# Altium footprint library PCBLIB.PcbLib: 557 footprints (part 11 of 36)
Each footprint in its own frame and in the unit in brackets; x right, y up, seen from the top. Pads: shape width x height; smd on the part's side, far side on the other; paste and mask are expansions set on the pad; w line width, h text height; cw(c..) or ccw(c..) is an arc to the next point about the centre after c.
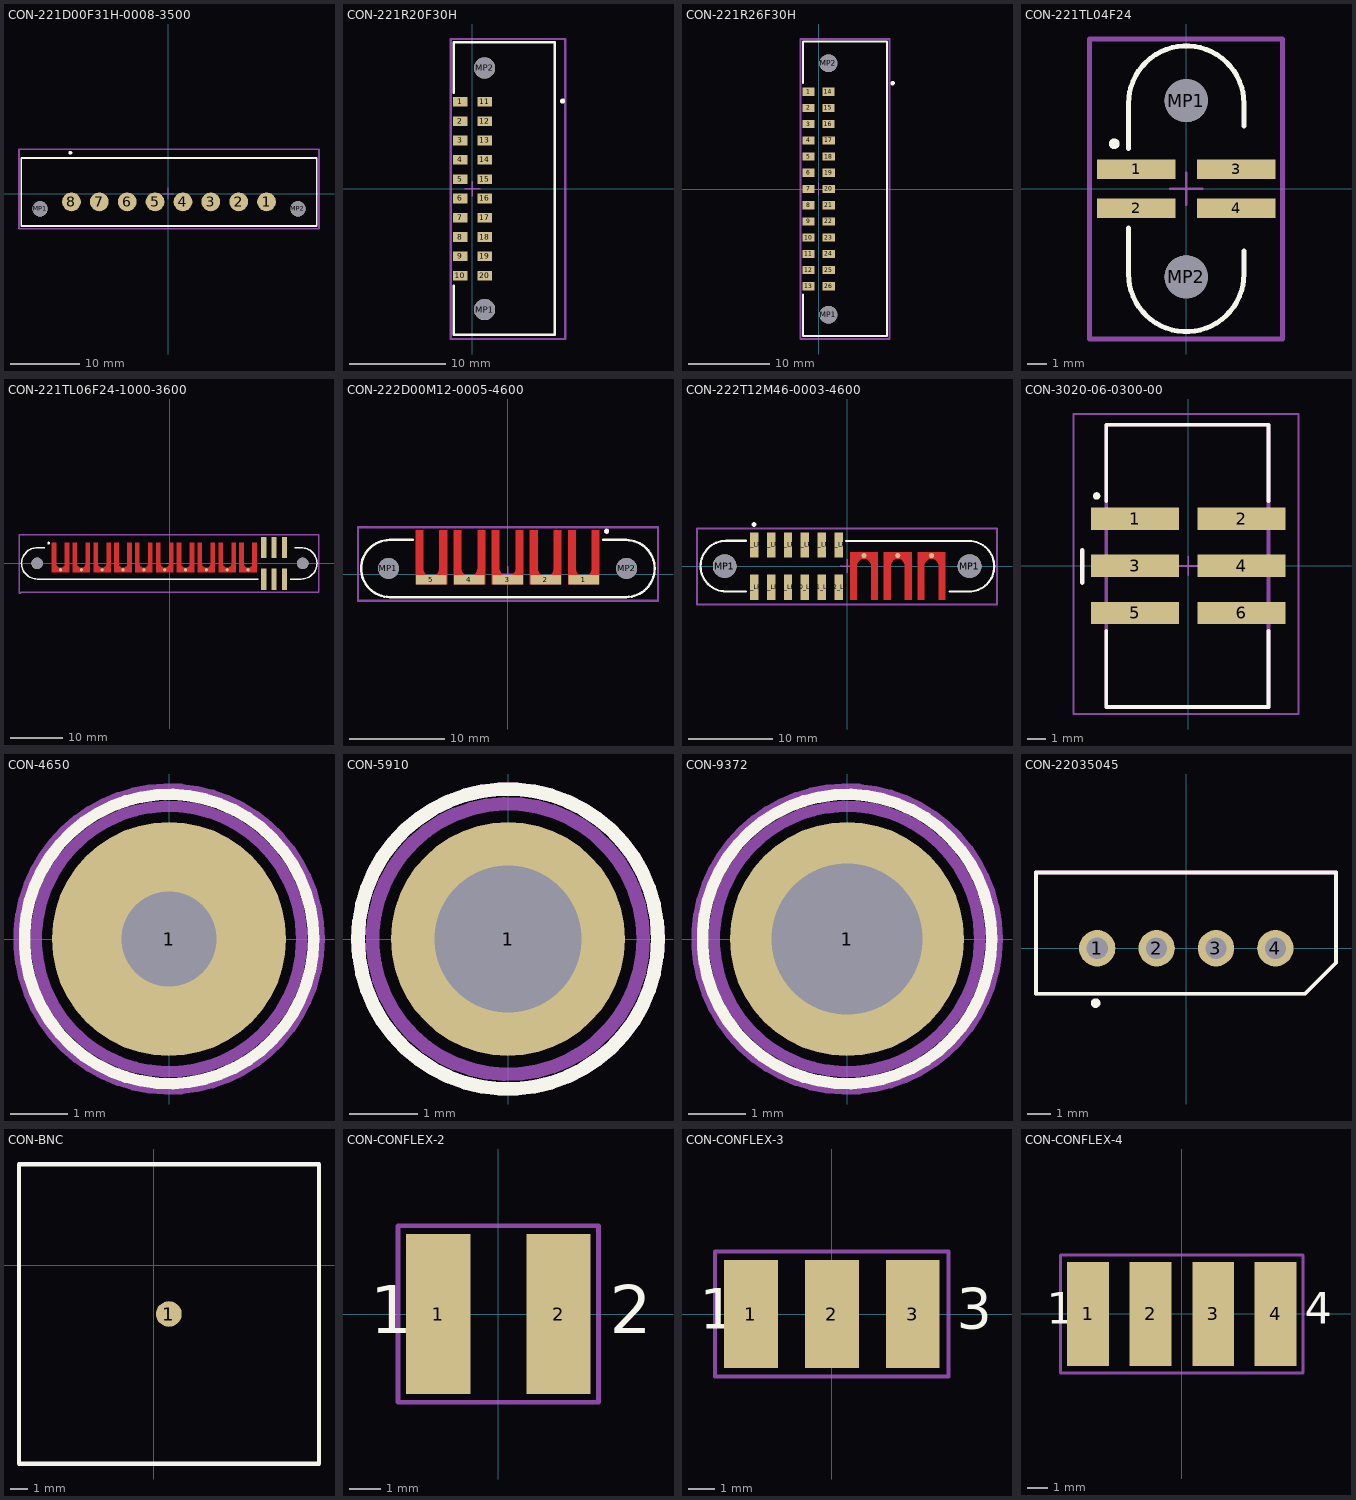
[diagram p10: the footprints below, top view; thin cyan lines are the x and y axes]

## CON-221D00F31H-0008-3500 [mm]
pads (10):
  round 2.7 smd: 1(14.1,-1.2) 2(10.1,-1.2) 3(6.1,-1.2) 4(2.1,-1.2) 5(-1.9,-1.2) 6(-5.9,-1.2) 7(-9.9,-1.2) 8(-13.9,-1.2)
  round 2.2 hole 2.2 unplated: MP1(-18.4,-2.2) MP2(18.6,-2.2)
Top Overlay:
  circle w0.3: c-14.05,5.85 r0.12
  lines w0.254: -21.1,-4.675 21.3,-4.675 21.3,5.1 -21.1,5.1 -21.1,-4.675
Mechanical 15:
  lines w0.15: -0.8,0 0,0 ; 0,-0.8 0,0 ; 0,0.8 0,0 ; 0.8,0 0,0
  lines w0.254: -21.425,-5.05 21.625,-5.05 21.625,6.35 -21.425,6.35 -21.425,-5.05
3D body "221D00F31H-0008-3500.STEP": height 5.33, standoff -7.5, extent -20.9,-4.5 21.1,4.85

## CON-221R20F30H [mm]
pads (22):
  rect 1.5x1 smd mask+0.05: 1(-1.25,9) 2(-1.25,7) 3(-1.25,5) 4(-1.25,3) 5(-1.25,1) 6(-1.25,-1) 7(-1.25,-3) 8(-1.25,-5) 9(-1.25,-7) 10(-1.25,-9) 11(1.25,9) 12(1.25,7) 13(1.25,5) 14(1.25,3) 15(1.25,1) 16(1.25,-1) 17(1.25,-3) 18(1.25,-5) 19(1.25,-7) 20(1.25,-9)
  round 2.2 hole 2.2 unplated: MP1(1.25,-12.5) MP2(1.25,12.5)
Top Overlay:
  circle w0.3: c9.325,9.075 r0.12
  lines w0.254: -1.95,-10.025 -1.95,-15.125 8.525,-15.125 8.525,15.15 -1.95,15.15 -1.95,9.95
Mechanical 15:
  lines w0.15: -0.8,0 0,0 ; 0,-0.8 0,0 ; 0,0.8 0,0 ; 0.8,0 0,0
  lines w0.254: -2.25,-15.55 9.6,-15.55 9.6,15.5 -2.25,15.5 -2.25,-15.55
3D body "221R20F30H.STEP": height 5.89, standoff -4.93, extent -1.718,-15 8.35,15

## CON-221R26F30H [mm]
pads (28):
  rect 1.5x1 smd mask+0.05: 1(-1.25,12) 2(-1.25,10) 3(-1.25,8) 4(-1.25,6) 5(-1.25,4) 6(-1.25,2) 7(-1.25,0) 8(-1.25,-2) 9(-1.25,-4) 10(-1.25,-6) 11(-1.25,-8) 12(-1.25,-10) 13(-1.25,-12) 14(1.2,12) 15(1.2,10) 16(1.2,8) 17(1.25,6) 18(1.25,4) 19(1.25,2) 20(1.25,0) 21(1.25,-2) 22(1.25,-4) 23(1.25,-6) 24(1.25,-8) 25(1.25,-10) 26(1.25,-12)
  round 2.2 hole 2.2 unplated: MP1(1.2,-15.5) MP2(1.2,15.5)
Top Overlay:
  circle w0.3: c9.125,13.05 r0.12
  lines w0.254: -1.95,-13.025 -1.95,-18.15 8.45,-18.15 8.45,18.175 -1.925,18.175 -1.925,13.05
Mechanical 15:
  lines w0.15: -0.8,0 0,0 ; 0,-0.8 0,0 ; 0,0.8 0,0 ; 0.8,0 0,0
  lines w0.254: -2.25,-18.5 -2.25,18.5 8.725,18.5 8.725,-18.5 -2.25,-18.5
3D body "221R26F30H.STEP": height 5.87, standoff -4.96, extent -1.768,-18 8.3,18

## CON-221TL04F24 [mm]
pads (6):
  rect 4x1 smd mask+0.05: 1(-2.55,1) 2(-2.55,-1) 3(2.55,1) 4(2.55,-1)
  round 2.2 hole 2.2 unplated: MP1(0,4.5) MP2(0,-4.5)
Top Overlay:
  circle w0.3: c-3.675,2.3 r0.12
  lines w0.254: -2.95,-2 -2.95,-4.35 ccw(c0,-4.35) 2.95,-4.35 2.95,-3.175 ; -2.95,2.05 -2.95,4.35 cw(c0,4.35) 2.95,4.35 2.95,3.2
Mechanical 15:
  lines w0.15: -0.8,0 0,0 ; 0,-0.8 0,0 ; 0,0.8 0,0 ; 0.8,0 0,0
  lines w0.254: -4.95,-7.675 -4.95,7.65 4.925,7.65 4.925,-7.675 -4.95,-7.675
3D body "221TL04F24.STEP": height 5.9, standoff -7, extent -4.389,-7 4.389,7

## CON-221TL06F24-1000-3600 [mm]
pads (18):
  round 0.6 smd mask+0.05: 1_HP(-21,-1.225) 2_HP(-17,-1.225) 3_HP(-13,-1.225) 4_HP(-9,-1.225) 5_HP(-5,-1.225) 6_HP(-1,-1.225) 7_HP(3,-1.225) 8_HP(7,-1.225) 9_HP(11,-1.225) 10_HP(15,-1.225)
  rect 1x4.1 smd mask+0.05: 1_LF(18,-3.05) 2_LF(20,-3.05) 3_LF(22,-3.05) 4_LF(18,3.05) 5_LF(20,3.05) 6_LF(22,3.05)
  round 2.2 hole 2.2 unplated: MP1(25.5,0) MP2(-25.5,0)
Top Layer:
  region: 13.35,4 13.35,-1.65 16.65,-1.65 16.65,4 15.85,4 15.85,0 15.843,-0.111 15.785,-0.325 15.674,-0.517 15.517,-0.674 15.325,-0.785 15.111,-0.843 14.889,-0.843 14.675,-0.785 14.483,-0.674 14.326,-0.517 14.215,-0.325 14.157,-0.111 14.15,0 14.15,4
  region: 9.35,4 9.35,-1.65 12.65,-1.65 12.65,4 11.85,4 11.85,0 11.843,-0.111 11.785,-0.325 11.674,-0.517 11.517,-0.674 11.325,-0.785 11.111,-0.843 10.889,-0.843 10.675,-0.785 10.483,-0.674 10.326,-0.517 10.215,-0.325 10.157,-0.111 10.15,0 10.15,4
  region: 5.35,4 5.35,-1.65 8.65,-1.65 8.65,4 7.85,4 7.85,0 7.843,-0.111 7.785,-0.325 7.674,-0.517 7.517,-0.674 7.325,-0.785 7.111,-0.843 6.889,-0.843 6.675,-0.785 6.483,-0.674 6.326,-0.517 6.215,-0.325 6.157,-0.111 6.15,0 6.15,4
  region: 1.35,4 1.35,-1.65 4.65,-1.65 4.65,4 3.85,4 3.85,0 3.843,-0.111 3.785,-0.325 3.674,-0.517 3.517,-0.674 3.325,-0.785 3.111,-0.843 2.889,-0.843 2.675,-0.785 2.483,-0.674 2.326,-0.517 2.215,-0.325 2.157,-0.111 2.15,0 2.15,4
  region: -2.65,4 -2.65,-1.65 0.65,-1.65 0.65,4 -0.15,4 -0.15,0 -0.157,-0.111 -0.215,-0.325 -0.326,-0.517 -0.483,-0.674 -0.675,-0.785 -0.889,-0.843 -1.111,-0.843 -1.325,-0.785 -1.517,-0.674 -1.674,-0.517 -1.785,-0.325 -1.843,-0.111 -1.85,0 -1.85,4
  region: -6.65,4 -6.65,-1.65 -3.35,-1.65 -3.35,4 -4.15,4 -4.15,0 -4.157,-0.111 -4.215,-0.325 -4.326,-0.517 -4.483,-0.674 -4.675,-0.785 -4.889,-0.843 -5.111,-0.843 -5.325,-0.785 -5.517,-0.674 -5.674,-0.517 -5.785,-0.325 -5.843,-0.111 -5.85,0 -5.85,4
  region: -10.65,4 -10.65,-1.65 -7.35,-1.65 -7.35,4 -8.15,4 -8.15,0 -8.157,-0.111 -8.215,-0.325 -8.326,-0.517 -8.483,-0.674 -8.675,-0.785 -8.889,-0.843 -9.111,-0.843 -9.325,-0.785 -9.517,-0.674 -9.674,-0.517 -9.785,-0.325 -9.843,-0.111 -9.85,0 -9.85,4
  region: -14.65,4 -14.65,-1.65 -11.35,-1.65 -11.35,4 -12.15,4 -12.15,0 -12.157,-0.111 -12.215,-0.325 -12.326,-0.517 -12.483,-0.674 -12.675,-0.785 -12.889,-0.843 -13.111,-0.843 -13.325,-0.785 -13.517,-0.674 -13.674,-0.517 -13.785,-0.325 -13.843,-0.111 -13.85,0 -13.85,4
  region: -18.65,4 -18.65,-1.65 -15.35,-1.65 -15.35,4 -16.15,4 -16.15,0 -16.157,-0.111 -16.215,-0.325 -16.326,-0.517 -16.483,-0.674 -16.675,-0.785 -16.889,-0.843 -17.111,-0.843 -17.325,-0.785 -17.517,-0.674 -17.674,-0.517 -17.785,-0.325 -17.843,-0.111 -17.85,0 -17.85,4
  region: -22.65,4 -22.65,-1.65 -19.35,-1.65 -19.35,4 -20.15,4 -20.15,0 -20.157,-0.111 -20.215,-0.325 -20.326,-0.517 -20.483,-0.674 -20.675,-0.785 -20.889,-0.843 -21.111,-0.843 -21.325,-0.785 -21.517,-0.674 -21.674,-0.517 -21.785,-0.325 -21.843,-0.111 -21.85,0 -21.85,4
Top Overlay:
  circle w0.3: c-23.275,3.9 r0.12
  lines w0.254: -24.025,3 -25.5,3 ccw(c-25.5,0) -25.5,-3 17,-3 ; 23.15,-3 25.25,-3 ccw(c25.25,0) 25.25,3 23.95,3
Top Paste:
  drawing of 10 lines, arcs and shapes, not listed
Top Solder:
  drawing of 10 lines, arcs and shapes, not listed
Mechanical 15:
  lines w0.15: -0.8,0 0,0 ; 0,-0.8 0,0 ; 0,0.8 0,0 ; 0.8,0 0,0
  lines w0.254: -28.975,-5.7 -28.725,-5.7 -28.575,-5.55 28.625,-5.55 28.625,-5.25 28.625,5.475 -28.975,5.475 -28.975,-5.7
3D body "221TL06F24-1000-3600.STEP": height 5.85, standoff -7.05, extent -28.075,-4.353 27.925,4.425

## CON-222D00M12-0005-4600 [mm]
pads (7):
  rect 3.2x1 smd: 1(8,-0.592) 2(4,-0.592) 3(0,-0.592) 4(-4,-0.592) 5(-8,-0.592)
  round 2.2 hole 2.2: MP1(-12.5,0.593) MP2(12.5,0.593)
Top Layer:
  region: -9.65,4.593 -9.65,-1.057 -6.35,-1.057 -6.35,4.592 -7.15,4.593 -7.15,0.593 -7.157,0.482 -7.215,0.267 -7.326,0.075 -7.483,-0.082 -7.675,-0.193 -7.889,-0.25 -8.111,-0.25 -8.325,-0.193 -8.517,-0.082 -8.674,0.075 -8.785,0.267 -8.843,0.482 -8.85,0.592 -8.85,4.593
  region: -5.65,4.593 -5.65,-1.057 -2.35,-1.057 -2.35,4.592 -3.15,4.593 -3.15,0.593 -3.157,0.482 -3.215,0.267 -3.326,0.075 -3.483,-0.082 -3.675,-0.193 -3.889,-0.25 -4.111,-0.25 -4.325,-0.193 -4.517,-0.082 -4.674,0.075 -4.785,0.267 -4.843,0.482 -4.85,0.592 -4.85,4.593
  region: -1.65,4.593 -1.65,-1.057 1.65,-1.057 1.65,4.592 0.85,4.593 0.85,0.593 0.843,0.482 0.785,0.267 0.674,0.075 0.517,-0.082 0.325,-0.193 0.111,-0.25 -0.111,-0.25 -0.325,-0.193 -0.517,-0.082 -0.674,0.075 -0.785,0.267 -0.843,0.482 -0.85,0.592 -0.85,4.593
  region: 2.35,4.593 2.35,-1.057 5.65,-1.057 5.65,4.592 4.85,4.593 4.85,0.593 4.843,0.482 4.785,0.267 4.674,0.075 4.517,-0.082 4.325,-0.193 4.111,-0.25 3.889,-0.25 3.675,-0.193 3.483,-0.082 3.326,0.075 3.215,0.267 3.157,0.482 3.15,0.592 3.15,4.593
  region: 6.35,4.593 6.35,-1.057 9.65,-1.057 9.65,4.592 8.85,4.593 8.85,0.593 8.843,0.482 8.785,0.267 8.674,0.075 8.517,-0.082 8.325,-0.193 8.111,-0.25 7.889,-0.25 7.675,-0.193 7.483,-0.082 7.326,0.075 7.215,0.267 7.157,0.482 7.15,0.592 7.15,4.593
Top Overlay:
  circle w0.3: c10.4,4.5 r0.12
  lines w0.254: -9.95,3.582 -12.375,3.582 ccw(c-12.375,0.583) -12.375,-2.417 12.45,-2.417 ccw(c12.45,0.583) 12.45,3.582 10.025,3.582
Top Paste:
  region: -9.65,4.593 -8.85,4.593 -8.85,0.6 -8.846,0.516 -8.813,0.353 -8.75,0.199 -8.657,0.061 -8.539,-0.057 -8.401,-0.15 -8.247,-0.214 -8.083,-0.246 -8,-0.25 -7.993,-0.25 -7.91,-0.246 -7.748,-0.214 -7.595,-0.151 -7.458,-0.059 -7.341,0.058 -7.249,0.195 -7.186,0.348 -7.154,0.51 -7.15,0.593 -7.15,4.593 -6.35,4.593 -6.35,-1.057 -9.65,-1.057
  region: -5.65,4.593 -4.85,4.593 -4.85,0.6 -4.846,0.516 -4.813,0.353 -4.75,0.199 -4.657,0.061 -4.539,-0.057 -4.401,-0.15 -4.247,-0.214 -4.083,-0.246 -4,-0.25 -3.993,-0.25 -3.91,-0.246 -3.748,-0.214 -3.595,-0.151 -3.458,-0.059 -3.341,0.058 -3.249,0.195 -3.186,0.348 -3.154,0.51 -3.15,0.593 -3.15,4.593 -2.35,4.593 -2.35,-1.057 -5.65,-1.057
  region: -1.65,4.593 -0.85,4.593 -0.85,0.6 -0.846,0.516 -0.813,0.353 -0.75,0.199 -0.657,0.061 -0.539,-0.057 -0.401,-0.15 -0.247,-0.214 -0.083,-0.246 0,-0.25 0.007,-0.25 0.09,-0.246 0.252,-0.214 0.405,-0.151 0.542,-0.059 0.659,0.058 0.751,0.195 0.814,0.348 0.846,0.51 0.85,0.593 0.85,4.593 1.65,4.593 1.65,-1.057 -1.65,-1.057
  region: 2.35,4.593 3.15,4.593 3.15,0.6 3.154,0.516 3.187,0.353 3.25,0.199 3.343,0.061 3.461,-0.057 3.599,-0.15 3.753,-0.214 3.917,-0.246 4,-0.25 4.007,-0.25 4.09,-0.246 4.252,-0.214 4.405,-0.151 4.542,-0.059 4.659,0.058 4.751,0.195 4.814,0.348 4.846,0.51 4.85,0.593 4.85,4.593 5.65,4.593 5.65,-1.057 2.35,-1.057
  region: 6.35,4.593 7.15,4.593 7.15,0.6 7.154,0.516 7.187,0.353 7.25,0.199 7.343,0.061 7.461,-0.057 7.599,-0.15 7.753,-0.214 7.917,-0.246 8,-0.25 8.007,-0.25 8.09,-0.246 8.252,-0.214 8.405,-0.151 8.542,-0.059 8.659,0.058 8.751,0.195 8.814,0.348 8.846,0.51 8.85,0.593 8.85,4.593 9.65,4.593 9.65,-1.057 6.35,-1.057
Top Solder:
  region: -9.65,4.593 -9.65,-1.057 -6.35,-1.057 -6.35,4.592 -7.15,4.593 -7.15,0.593 -7.157,0.482 -7.215,0.267 -7.326,0.075 -7.483,-0.082 -7.675,-0.193 -7.889,-0.25 -8.111,-0.25 -8.325,-0.193 -8.517,-0.082 -8.674,0.075 -8.785,0.267 -8.843,0.482 -8.85,0.592 -8.85,4.593
  region: -5.65,4.593 -5.65,-1.057 -2.35,-1.057 -2.35,4.592 -3.15,4.593 -3.15,0.593 -3.157,0.482 -3.215,0.267 -3.326,0.075 -3.483,-0.082 -3.675,-0.193 -3.889,-0.25 -4.111,-0.25 -4.325,-0.193 -4.517,-0.082 -4.674,0.075 -4.785,0.267 -4.843,0.482 -4.85,0.592 -4.85,4.593
  region: -1.65,4.593 -1.65,-1.057 1.65,-1.057 1.65,4.592 0.85,4.593 0.85,0.593 0.843,0.482 0.785,0.267 0.674,0.075 0.517,-0.082 0.325,-0.193 0.111,-0.25 -0.111,-0.25 -0.325,-0.193 -0.517,-0.082 -0.674,0.075 -0.785,0.267 -0.843,0.482 -0.85,0.592 -0.85,4.593
  region: 2.35,4.593 2.35,-1.057 5.65,-1.057 5.65,4.592 4.85,4.593 4.85,0.593 4.843,0.482 4.785,0.267 4.674,0.075 4.517,-0.082 4.325,-0.193 4.111,-0.25 3.889,-0.25 3.675,-0.193 3.483,-0.082 3.326,0.075 3.215,0.267 3.157,0.482 3.15,0.592 3.15,4.593
  region: 6.35,4.593 6.35,-1.057 9.65,-1.057 9.65,4.592 8.85,4.593 8.85,0.593 8.843,0.482 8.785,0.267 8.674,0.075 8.517,-0.082 8.325,-0.193 8.111,-0.25 7.889,-0.25 7.675,-0.193 7.483,-0.082 7.326,0.075 7.215,0.267 7.157,0.482 7.15,0.592 7.15,4.593
Mechanical 15:
  lines w0.15: -0.8,0 0,0 ; 0,-0.8 0,0 ; 0,0.8 0,0 ; 0.8,0 0,0
  lines w0.254: -15.7,-2.817 -15.7,4.933 15.8,4.933 15.8,-2.817 -15.7,-2.817
3D body "222D00M12-0005-4600.STEP": height 6.86, standoff -4.49, extent -15,-2.157 15,3.947

## CON-222T12M46-0003-4600 [mm]
pads (17):
  round 0.6 smd mask+0.05: 1_HP(2,1.25) 2_HP(6,1.25) 3_HP(10,1.25)
  rect 1x3 smd mask+0.05: 1_LF(-11,2.5) 2_LF(-9,2.5) 3_LF(-7,2.5) 4_LF(-5,2.5) 5_LF(-3,2.5) 6_LF(-1,2.5) 7_LF(-11,-2.5) 8_LF(-9,-2.5) 9_LF(-7,-2.5) 10_LF(-5,-2.5) 11_LF(-3,-2.5) 12_LF(-1,-2.5)
  round 2.8 hole 2.8 unplated: MP1(-14.5,0) MP1(14.5,0)
Top Layer:
  region: 3.65,-4 3.65,1.65 0.35,1.65 0.35,-4 1.15,-4 1.15,0 1.157,0.111 1.215,0.325 1.326,0.517 1.483,0.674 1.675,0.785 1.889,0.843 2.111,0.843 2.325,0.785 2.517,0.674 2.674,0.517 2.785,0.325 2.843,0.111 2.85,0 2.85,-4
  region: 7.65,-4 7.65,1.65 4.35,1.65 4.35,-4 5.15,-4 5.15,0 5.157,0.111 5.215,0.325 5.326,0.517 5.483,0.674 5.675,0.785 5.889,0.843 6.111,0.843 6.325,0.785 6.517,0.674 6.674,0.517 6.785,0.325 6.843,0.111 6.85,0 6.85,-4
  region: 11.65,-4 11.65,1.65 8.35,1.65 8.35,-4 9.15,-4 9.15,0 9.157,0.111 9.215,0.325 9.326,0.517 9.483,0.674 9.675,0.785 9.889,0.843 10.111,0.843 10.325,0.785 10.517,0.674 10.674,0.517 10.785,0.325 10.843,0.111 10.85,0 10.85,-4
Top Overlay:
  circle w0.3: c-11.025,4.925 r0.12
  lines w0.254: -12,-3 -14.35,-3 cw(c-14.35,0) -14.35,3 -12,3 ; -0.125,2.975 14.425,2.975 cw(c14.425,-0.025) 14.425,-3.025 12.15,-3.025
Top Solder:
  region: 11.65,-4 11.65,1.65 8.35,1.65 8.35,-4 9.15,-4 9.15,0 9.157,0.111 9.215,0.325 9.326,0.517 9.483,0.674 9.675,0.785 9.889,0.843 10.111,0.843 10.325,0.785 10.517,0.674 10.674,0.517 10.785,0.325 10.843,0.111 10.85,0 10.85,-4
  region: 7.65,-4 7.65,1.65 4.35,1.65 4.35,-4 5.15,-4 5.15,0 5.157,0.111 5.215,0.325 5.326,0.517 5.483,0.674 5.675,0.785 5.889,0.843 6.111,0.843 6.325,0.785 6.517,0.674 6.674,0.517 6.785,0.325 6.843,0.111 6.85,0 6.85,-4
  region: 3.65,-4 3.65,1.65 0.35,1.65 0.35,-4 1.15,-4 1.15,0 1.157,0.111 1.215,0.325 1.326,0.517 1.483,0.674 1.675,0.785 1.889,0.843 2.111,0.843 2.325,0.785 2.517,0.674 2.674,0.517 2.785,0.325 2.843,0.111 2.85,0 2.85,-4
Mechanical 15:
  lines w0.15: -0.8,0 0,0 ; 0,-0.8 0,0 ; 0,0.8 0,0 ; 0.8,0 0,0
  lines w0.254: -17.775,-4.55 -17.775,4.45 -17.55,4.45 17.75,4.45 17.75,-4.55 -17.775,-4.55
3D body "222T12M46-0003-4600.STEP": height 5.3, standoff -5.6, extent -17,-3.354 17,3.25

## CON-3020-06-0300-00 [mm]
pads (6):
  rect 4.75x1.2 smd: 1(-2.875,2.54) 2(2.875,2.54) 3(-2.875,0) 4(2.875,0) 5(-2.875,-2.54) 6(2.875,-2.54)
Top Overlay:
  circle w0.2: c-4.95,3.775 r0.1
  lines w0.2: -4.425,-3.5 -4.425,-7.62 4.325,-7.62 4.325,-3.5 ; -4.425,3.5 -4.425,7.62 4.325,7.62 4.325,3.5
  lines w0.254: -5.725,-0.9 -5.725,0.85
Mechanical 15:
  lines w0.1: -0.5,0 0.5,0 ; 0,-0.5 0,0.5 ; -6.2,-8 5.95,-8 5.95,8.2 -6.2,8.2 -6.2,-8
ASM Top:
  lines w0.2: -4.425,-7.625 4.325,-7.625 4.325,7.625 -4.425,7.625 -4.425,-7.625
  text ".designator" at 0,0 h1.2
3D body "HTST-103-01-T-DV-P-TR.stp": height 11.44, standoff 0.01, extent -5.588,-7.62 5.588,7.62

## CON-4650 [mil]
height 1800
pads (1):
  round 160 hole 65: 1(0,0)
Top Overlay:
  circle w7.87: c0,0 r98.66
Bottom Overlay:
  circle w7.87: c0,0 r98.66
Mechanical 15:
  circle w7.87: c0,0 r102.36
  lines w3.94: -39.37,0 39.37,0 ; 0,-39.37 0,39.37
ASM Top:
  circle w7.87: c0,0 r90.64
  text ".designator" at -31.5,-11.81 h59.06
3D body "mill-max-4650-0-00-15-00-00-03-0 (1).step": height 925.5, standoff -874.54, extent -62.49,-62.49 63.13,62.51

## CON-5910 [mil]
height 679.92
pads (1):
  round 135 hole 85: 1(0,0)
Top Overlay:
  circle w7.87: c0,0 r86.61
Mechanical 15:
  circle w7.87: c0,0 r86.61
  lines w3.94: -35.43,0 35.43,0 ; 0,-35.43 0,35.43
ASM Top:
  circle w7.87: c0,0 r78.15
  text ".designator" at -11.81,-3.94 h59.06
3D body "mill-max-5910-0-00-15-00-00-03-0.step": height 20.52, standoff -659.53, extent -55,-54.99 55,55.34

## CON-9372 [mil]
pads (1):
  round 160 hole 103: 1(0,0)
Top Overlay:
  circle w7.87: c0,0 r98.66
Bottom Overlay:
  circle w7.87: c0,0 r98.66
Mechanical 15:
  circle w7.87: c0,0 r102.36
  lines w3.94: -39.37,0 39.37,0 ; 0,-39.37 0,39.37
ASM Top:
  circle w7.87: c0,0 r90.64
  text ".designator" at -11.81,-11.81 h59.06
3D body "mill-max-9372-0-15-01-23-XX-10-0.step": height 12.54, standoff -107.5, extent -58.99,-58.99 59.05,59

## CON-22035045 [mil]
pads (4):
  round 60 hole 35: 1(-147,0) 2(-49,0) 3(49,0) 4(147,0)
Top Overlay:
  circle w7.87: c-149.61,-90.55 r3.94
  lines w5.91: 196,-75 247,-24
  lines w6: -248,-75 -248,125 247,125 247,-24 196,-75 -248,-75
ASM Top:
  lines w6: -248,-75 -248,125 247,125 247,-24 196,-75 -248,-75
  text ".designator" at -27.56,15.75 h31.5
3D body "022035045.stp": height 232.79, standoff -137.29, extent -244.1,-72.06 244.09,120.86

## CON-BNC [mm]
pads (1):
  round 1.5 smd: 1(0.88,-2.86)
Top Overlay:
  lines w0.254: -7.87,-11.61 9.643,-11.61 9.643,5.89 -7.87,5.89 -7.87,-11.61
3D body "Bnc_7684.stp": height 26.95, standoff 0.01, extent -7.87,-11.61 9.643,5.89

## CON-CONFLEX-2 [mil]
pads (2):
  rect 80x200 smd mask+4: 1(-75,0) 2(75,0)
Top Overlay:
  text "2" at 139,-24 h60
  text "1" at -160,-24 h60
ASM Top:
  lines w6: -125,-110 -125,110 125,110 125,-110 -125,-110

## CON-CONFLEX-3 [mil]
pads (3):
  rect 80x160 smd: 1(-120,0) 2(0,0) 3(120,0)
Top Overlay:
  text "1" at -196,-22 h60
  text "3" at 185,-22 h60
ASM Top:
  lines w6: -173,-93 -173,93 173,93 173,-93 -173,-93

## CON-CONFLEX-4 [mil]
pads (4):
  rect 80x200 smd: 1(-180,0) 2(-60,0) 3(60,0) 4(180,0)
Top Overlay:
  text "4" at 236,-19 h60
  text "1" at -259,-19 h60
ASM Top:
  lines w6: -233,-113 233,-113 233,113 -233,113 -233,-113